# Altium footprint library 8-Crystals.PcbLib: 104 footprints (part 5 of 7)
Each footprint in its own frame and in the unit in brackets; x right, y up, seen from the top. Pads: shape width x height; smd on the part's side, far side on the other; paste and mask are expansions set on the pad; w line width, h text height; cw(c..) or ccw(c..) is an arc to the next point about the centre after c.
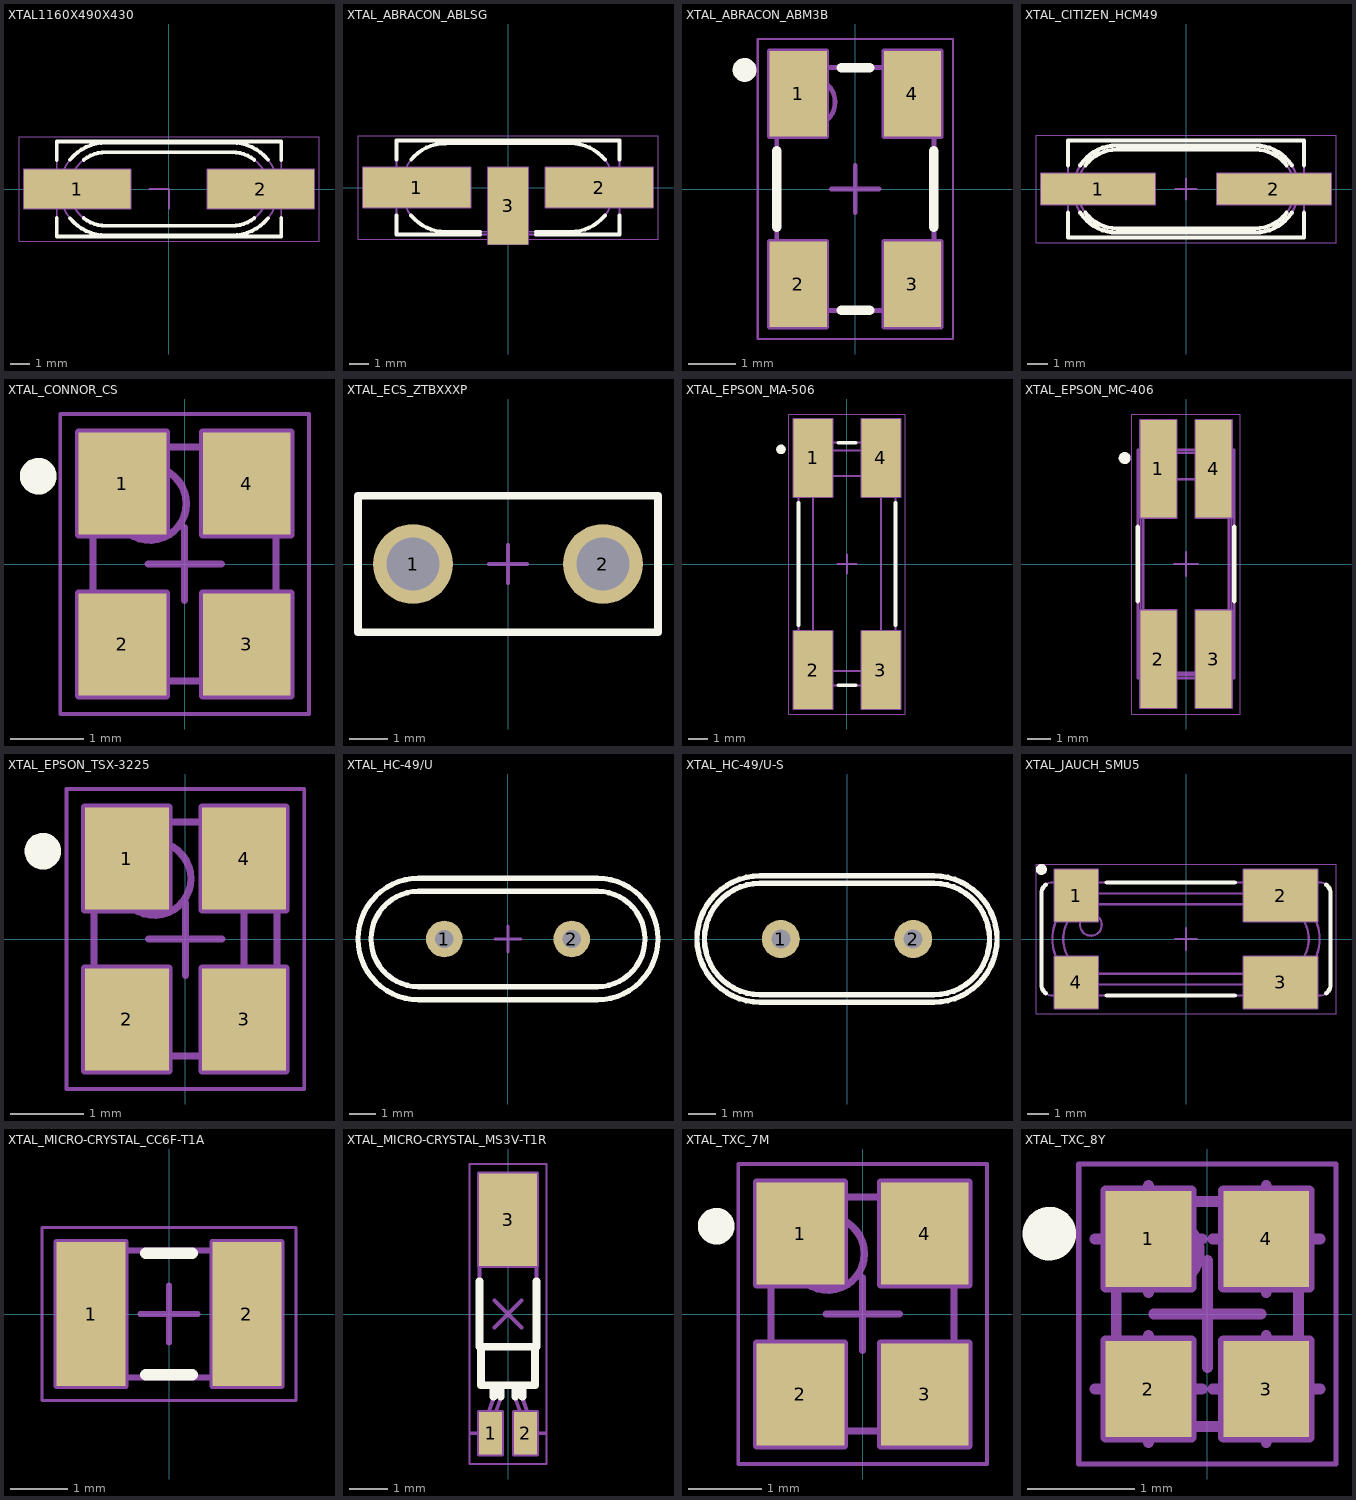
[diagram p4: the footprints below, top view; thin cyan lines are the x and y axes]

## XTAL1160X490X430 [mm] "HC49/4H SMX Case, SMD Cristal, Body 11.6x4.9mm"
height 4.3
pads (2):
  rect 5.5x2 smd: 1(-4.75,0) 2(4.75,0)
Top Overlay:
  lines w0.2: -5.8,-1.5 -5.8,-2.45 5.8,-2.45 5.8,-1.5 ; -5.8,1.5 -5.8,2.45 5.8,2.45 5.8,1.5 ; -5.114,-1.512 ccw(c-3.25,0) -3.25,-2.4 3.25,-2.4 ccw(c3.25,0) 5.114,-1.512 ; -5.114,1.512 cw(c-3.25,0) -3.25,2.4 3.25,2.4 cw(c3.25,0) 5.114,1.512 ; -4.406,-1.508 ccw(c-3.25,0) -3.25,-1.9 3.25,-1.9 ccw(c3.25,0) 4.406,-1.508 ; -4.406,1.508 cw(c-3.25,0) -3.25,1.9 ; -3.211,1.9 3.25,1.9 cw(c3.25,0) 4.406,1.508
Mechanical 8:
  lines w0.1: -5.75,0 -4.75,0 -4.75,-1 ; -1,0 0,0 0,-1 ; 3.75,0 4.75,0 4.75,-1 ; -7.5,-1 -2,-1 -2,1 -7.5,1 -7.5,-1 ; 2,-1 2,1 7.5,1 7.5,-1 2,-1
Mechanical 14:
  lines w0.1: -5.8,-0.3 -6.7,-0.3 -6.7,0.3 -5.8,0.3 ; -5.15,0 ccw(c-3.25,0) -3.25,-1.9 ; 5.15,0 cw(c3.25,0) 3.25,-1.9 ; 5.8,-0.3 6.7,-0.3 6.7,0.3 5.8,0.3 ; -3.25,-1.9 cw(c-3.25,0) -3.25,1.9 3.25,1.9 cw(c3.25,0) 3.25,-1.9 ; -3.25,-1.9 3.25,-1.9 ; -5.8,-2.45 5.8,-2.45 5.8,2.45 -5.8,2.45 -5.8,-2.45 ; -3.25,-2.4 cw(c-3.25,0) -3.25,2.4 3.25,2.4 cw(c3.25,0) 3.25,-2.4 -3.25,-2.4
Mechanical 15:
  lines w0.05: -7.75,-2.7 7.75,-2.7 7.75,2.7 -7.75,2.7 -7.75,-2.7
3D body "p550-200.stp": height 0.02, standoff 0, extent 2,-1 7.5,1
3D body "p550-200.stp": height 0.02, standoff 0, extent -7.5,-1 -2,1
3D body "XTAL_1160X490X430.stp": height 4.3, standoff 0, extent -7.15,-2.45 7.15,2.45

## XTAL_ABRACON_ABLSG [mm] "HC/49US (AT49) SMD Cristal, Body 11.4x4.7mm, ABLSG Serie"
height 4.3
pads (3):
  rect 5.6x2.1 smd: 1(-4.75,0) 2(4.75,0)
  rect 2.1x4 smd: 3(0,-0.95)
Top Overlay:
  lines w0.2: -5.8,-1.45 -5.8,-2.45 -1.45,-2.45 ; -5.8,1.45 -5.8,2.45 5.8,2.45 5.8,1.45 ; -5.036,-1.45 ccw(c-3.25,0) -3.25,-2.3 -1.45,-2.3 ; -5.035,1.45 cw(c-3.25,0) -3.25,2.299 ; -3.25,2.3 3.25,2.3 cw(c3.25,0) 5.035,1.45 ; 1.45,-2.45 5.8,-2.45 5.8,-1.45 ; 1.45,-2.3 3.25,-2.3 ccw(c3.25,0) 5.035,-1.45
Mechanical 8:
  lines w0.1: -5.75,0 -4.75,0 ; -5.25,0 -4.75,0 ; -4.75,-1 -4.75,0 ; -4.75,-0.5 -4.75,0 ; -4.75,0.5 -4.75,0 ; -4.75,1 -4.75,0 ; -4.25,0 -4.75,0 ; -3.75,0 -4.75,0 ; -1,-0.95 0,-0.95 ; -1,0 0,0 ; 0,-1.95 0,-0.95 ; 0,1 0,0 ; 1,-0.95 0,-0.95 ; 1,0 0,0 ; 3.75,0 4.75,0 ; 4.25,0 4.75,0 ; 4.75,-1 4.75,0 ; 4.75,-0.5 4.75,0 ; 4.75,0.5 4.75,0 ; 4.75,1 4.75,0 ; 5.25,0 4.75,0 ; 5.75,0 4.75,0 ; -7.55,-1.05 -1.95,-1.05 -1.95,1.05 -7.55,1.05 -7.55,-1.05 ; -1.05,-2.95 1.05,-2.95 1.05,1.05 -1.05,1.05 -1.05,-2.95 ; 1.95,-1.05 7.55,-1.05 7.55,1.05 1.95,1.05 1.95,-1.05
Mechanical 14:
  lines w0.1: -5.8,-0.3 -6.6,-0.3 -6.6,0.3 -5.8,0.3 ; -3.25,2.299 ccw(c-3.25,0) -3.25,-2.3 3.25,-2.3 ccw(c3.25,0) 3.25,2.3 -3.25,2.3 ; -0.3,-2.45 -0.3,-2.9 0.3,-2.9 0.3,-2.45 ; 5.8,-0.3 6.6,-0.3 6.6,0.3 5.8,0.3 ; -5.8,-2.45 5.8,-2.45 5.8,2.45 -5.8,2.45 -5.8,-2.45
Mechanical 15:
  lines w0.05: -7.8,-2.7 -7.8,2.7 7.8,2.7 7.8,-2.7 -7.8,-2.7
3D body "p400-210.stp": height 0.02, standoff 0, extent -1.05,-3.016 1.05,0.984
3D body "p550-200.stp": height 0.02, standoff 0, extent 2,-1 7.5,1
3D body "p550-200.stp": height 0.02, standoff 0, extent -7.5,-1 -2,1
3D body "XTAL_ABRACON_ABLSG.stp": height 4.2, standoff 0, extent -6.6,-2.9 6.6,2.45

## XTAL_ABRACON_ABM3B [mm] "ABM3B Serie, SMD Cristal, Body 5.x3.2mm"
height 1.1
pads (4):
  rect 1.2x1.8 smd: 1(-1.2,2) 2(-1.2,-2) 3(1.2,-2) 4(1.2,2)
Top Overlay:
  circle w0.25: c-2.325,2.5 r0.125
  lines w0.2: -1.65,-0.8 -1.65,0.8 ; -0.3,-2.55 0.3,-2.55 ; -0.3,2.55 0.3,2.55 ; 1.65,-0.8 1.65,0.8
Mechanical 8:
  lines w0.1: -1.7,-2 -1.2,-2 ; -1.7,2 -1.2,2 ; -1.2,-2.5 -1.2,-2 ; -1.2,-1.5 -1.2,-2 ; -1.2,1.5 -1.2,2 ; -1.2,2.5 -1.2,2 ; -0.7,-2 -1.2,-2 ; -0.7,2 -1.2,2 ; -0.5,0 0,0 ; 0,-0.5 0,0 ; 0,0.5 0,0 ; 0.5,0 0,0 ; 0.7,-2 1.2,-2 ; 0.7,2 1.2,2 ; 1.2,-2.5 1.2,-2 ; 1.2,-1.5 1.2,-2 ; 1.2,1.5 1.2,2 ; 1.2,2.5 1.2,2 ; 1.7,-2 1.2,-2 ; 1.7,2 1.2,2 ; -1.8,-2.9 -0.6,-2.9 -0.6,-1.1 -1.8,-1.1 -1.8,-2.9 ; -1.8,1.1 -0.6,1.1 -0.6,2.9 -1.8,2.9 -1.8,1.1 ; 0.6,-2.9 0.6,-1.1 1.8,-1.1 1.8,-2.9 0.6,-2.9 ; 0.6,1.1 1.8,1.1 1.8,2.9 0.6,2.9 0.6,1.1
Mechanical 14:
  circle w0.1: c-0.925,1.825 r0.5
  lines w0.1: -1.65,2.25 -1.65,-2.25 -1.35,-2.55 1.35,-2.55 1.65,-2.25 1.65,2.25 1.35,2.55 -1.35,2.55 ; -1.65,2.25 -1.35,2.55 ; -1.65,2.25 -1.35,2.55
Mechanical 15:
  lines w0.05: -2.05,-3.15 2.05,-3.15 2.05,3.15 -2.05,3.15 -2.05,-3.15
3D body "XTAL_ABRACON_ABM3B.stp": height 1.1, standoff 0, extent -1.65,-2.55 1.65,2.55
3D body "p180-127.stp": height 0.02, standoff 0, extent -1.835,-2.9 -0.565,-1.1
3D body "p180-127.stp": height 0.02, standoff 0, extent 0.565,-2.9 1.835,-1.1
3D body "p180-127.stp": height 0.02, standoff 0, extent 0.565,1.1 1.835,2.9
3D body "p180-127.stp": height 0.02, standoff 0, extent -1.835,1.1 -0.565,2.9

## XTAL_CITIZEN_HCM49 [mm] "CITIZEN HCM49 Case, SMD Cristal, Body 11.4 x 4.7mm"
height 4.3
pads (2):
  rect 5.5x1.5 smd: 1(-4.25,0) 2(4.25,0)
Top Overlay:
  lines w0.2: -5.7,-1.15 -5.7,-2.35 5.7,-2.35 5.7,-1.15 ; -5.7,1.15 -5.7,2.35 5.7,2.35 5.7,1.15 ; -5.108,-1.15 ccw(c-3.345,0) -3.345,-2.105 3.345,-2.105 ccw(c3.345,0) 5.108,-1.15 ; -5.108,1.15 cw(c-3.345,0) -3.345,2.105 3.345,2.105 cw(c3.345,0) 5.108,1.15 ; -4.864,-1.15 ccw(c-3.345,0) -3.345,-1.905 3.345,-1.905 ccw(c3.345,0) 4.864,-1.15 ; -4.864,1.15 cw(c-3.345,0) -3.345,1.905 3.345,1.905 cw(c3.345,0) 4.864,1.15
Mechanical 8:
  lines w0.1: -4.75,0 -4.25,0 ; -4.25,-0.5 -4.25,0 ; -4.25,0.5 -4.25,0 ; -3.75,0 -4.25,0 ; -0.5,0 0,0 ; 0,-0.5 0,0 ; 0,0.5 0,0 ; 0.5,0 0,0 ; 3.75,0 4.25,0 ; 4.25,-0.5 4.25,0 ; 4.25,0.5 4.25,0 ; 4.75,0 4.25,0 ; -7,-0.75 -7,0.75 -1.5,0.75 -1.5,-0.75 -7,-0.75 ; 1.5,-0.75 1.5,0.75 7,0.75 7,-0.75 1.5,-0.75
Mechanical 14:
  lines w0.1: -5.7,-2.35 -5.7,2.35 5.7,2.35 5.7,-2.35 -5.7,-2.35 ; -3.345,-2.105 cw(c-3.345,0) -3.345,2.105 3.345,2.105 cw(c3.345,0) 3.345,-2.105 -3.345,-2.105 ; -3.345,-1.905 cw(c-3.345,0) -3.345,1.905 3.345,1.905 cw(c3.345,0) 3.345,-1.905 -3.345,-1.905
Mechanical 15:
  lines w0.05: -7.25,-2.6 7.25,-2.6 7.25,2.6 -7.25,2.6 -7.25,-2.6
3D body "XTAL_CITIZEN_HCM49.stp": height 4.3, standoff 0, extent -6.002,-2.35 6.002,2.35
3D body "p550-150.stp": height 0.02, standoff 0, extent -7,-0.75 -1.5,0.75
3D body "p550-150.stp": height 0.02, standoff 0, extent 1.5,-0.75 7,0.75

## XTAL_CONNOR_CS [mm] "4 Pins, 2.5x3.2mm, SMD Sealing Crystal, CS Serie"
height 0.8
pads (4):
  rect 1.2x1.4 smd: 1(-0.85,1.1) 2(-0.85,-1.1) 3(0.85,-1.1) 4(0.85,1.1)
Top Overlay:
  circle w0.25: c-2,1.2 r0.125
Mechanical 8:
  lines w0.1: -1.35,-1.1 -0.85,-1.1 ; -1.35,1.1 -0.85,1.1 ; -0.85,-1.6 -0.85,-1.1 ; -0.85,-0.6 -0.85,-1.1 ; -0.85,0.6 -0.85,1.1 ; -0.85,1.6 -0.85,1.1 ; -0.5,0 0,0 ; -0.35,-1.1 -0.85,-1.1 ; -0.35,1.1 -0.85,1.1 ; 0,-0.5 0,0 ; 0,0.5 0,0 ; 0.35,-1.1 0.85,-1.1 ; 0.35,1.1 0.85,1.1 ; 0.5,0 0,0 ; 0.85,-1.6 0.85,-1.1 ; 0.85,-0.6 0.85,-1.1 ; 0.85,0.6 0.85,1.1 ; 0.85,1.6 0.85,1.1 ; 1.35,-1.1 0.85,-1.1 ; 1.35,1.1 0.85,1.1 ; -1.45,-1.8 -1.45,-0.4 -0.25,-0.4 -0.25,-1.8 -1.45,-1.8 ; -1.45,0.4 -1.45,1.8 -0.25,1.8 -0.25,0.4 -1.45,0.4 ; 0.25,-1.8 0.25,-0.4 1.45,-0.4 1.45,-1.8 0.25,-1.8 ; 0.25,0.4 0.25,1.8 1.45,1.8 1.45,0.4 0.25,0.4
Mechanical 14:
  circle w0.1: c-0.475,0.825 r0.5
  lines w0.1: -1.25,-1.5 cw(c-1.25,-1.6) -1.15,-1.6 1.15,-1.6 cw(c1.25,-1.6) 1.25,-1.5 1.25,1.5 cw(c1.25,1.6) 1.15,1.6 -1.15,1.6 cw(c-1.25,1.6) -1.25,1.5 -1.25,-1.5
Mechanical 15:
  lines w0.05: -1.7,-2.05 -1.7,2.05 1.7,2.05 1.7,-2.05 -1.7,-2.05
3D body "XTAL_CONNOR_CS.stp": height 0.8, standoff 0, extent -1.25,-1.6 1.25,1.6
3D body "p140-120.stp": height 0.02, standoff 0, extent -1.45,-1.8 -0.25,-0.4
3D body "p140-120.stp": height 0.02, standoff 0, extent 0.25,-1.8 1.45,-0.4
3D body "p140-120.stp": height 0.02, standoff 0, extent 0.25,0.4 1.45,1.8
3D body "p140-120.stp": height 0.02, standoff 0, extent -1.45,0.4 -0.25,1.8

## XTAL_ECS_ZTBXXXP [mm] "ZTB Serie Leaded Ceramic Resonator, Body L 7.9 x W 3.6mm H 9.3, Pitch 5mm"
height 9.3
pads (2):
  round 2.1 hole 1.4: 1(-2.5,0) 2(2.5,0)
Top Overlay:
  lines w0.2: -3.95,-1.8 -3.95,1.8 3.95,1.8 3.95,-1.8 -3.95,-1.8
Mechanical 8:
  lines w0.1: -3,0 -2.5,0 ; -2.5,-0.5 -2.5,0 ; -2.5,0.5 -2.5,0 ; -2,0 -2.5,0 ; -0.5,0 0,0 ; 0,-0.5 0,0 ; 0,0.5 0,0 ; 0.5,0 0,0 ; 2,0 2.5,0 ; 2.5,-0.5 2.5,0 ; 2.5,0.5 2.5,0 ; 3,0 2.5,0
Mechanical 14:
  lines w0.1: -3.95,-1.8 3.95,-1.8 3.95,1.8 -3.95,1.8 -3.95,-1.8
3D body "XTAL_ECS_ZTBxxxP.stp": height 9.3, standoff -3.6, extent -3.95,-1.8 3.95,1.8

## XTAL_EPSON_MA-506 [mm] "EPSON Crystal; 12.7mm L X 5.08mm W X 4.6mm H"
height 4.6
pads (4):
  rect 2.05x4.1 smd: 1(-1.775,5.55) 2(-1.775,-5.55) 3(1.775,-5.55) 4(1.775,5.55)
Top Overlay:
  circle w0.25: c-3.455,6 r0.125
  lines w0.2: -2.54,-3.2 -2.54,3.2 ; -0.45,-6.35 0.45,-6.35 ; -0.45,6.35 0.45,6.35 ; 2.54,-3.2 2.54,3.2
Mechanical 8:
  lines w0.1: -2.275,-5.55 -1.775,-5.55 ; -2.275,5.55 -1.775,5.55 ; -1.775,-6.05 -1.775,-5.55 ; -1.775,-5.05 -1.775,-5.55 ; -1.775,5.05 -1.775,5.55 ; -1.775,6.05 -1.775,5.55 ; -1.275,-5.55 -1.775,-5.55 ; -1.275,5.55 -1.775,5.55 ; -0.5,0 0,0 ; 0,-0.5 0,0 ; 0,0.5 0,0 ; 0.5,0 0,0 ; 1.275,-5.55 1.775,-5.55 ; 1.275,5.55 1.775,5.55 ; 1.775,-6.05 1.775,-5.55 ; 1.775,-5.05 1.775,-5.55 ; 1.775,5.05 1.775,5.55 ; 1.775,6.05 1.775,5.55 ; 2.275,-5.55 1.775,-5.55 ; 2.275,5.55 1.775,5.55 ; -2.8,-7.6 -2.8,-3.5 -0.75,-3.5 -0.75,-7.6 -2.8,-7.6 ; -2.8,3.5 -2.8,7.6 -0.75,7.6 -0.75,3.5 -2.8,3.5 ; 0.75,-7.6 0.75,-3.5 2.8,-3.5 2.8,-7.6 0.75,-7.6 ; 0.75,3.5 0.75,7.6 2.8,7.6 2.8,3.5 0.75,3.5
Mechanical 14:
  lines w0.1: -2.54,-6.35 -1.79,-5.6 ; -2.54,-6.35 -2.54,6.35 ; -2.54,-6.35 2.54,-6.35 ; -2.54,6.35 -2.14,5.95 ; -2.54,6.35 2.54,6.35 ; -2.14,5.95 2.14,5.95 ; -2.14,5.95 -1.79,4.6 ; -1.79,-5.6 1.79,-5.6 ; -1.79,-5.6 -1.79,4.6 ; -1.79,4.6 1.79,4.6 ; 1.79,-5.6 2.54,-6.35 ; 1.79,-5.6 1.79,4.6 ; 1.79,4.6 2.14,5.95 ; 2.14,5.95 2.54,6.35 ; 2.54,-6.35 2.54,6.35
Mechanical 15:
  lines w0.05: -3.05,-7.85 -3.05,7.85 3.05,7.85 3.05,-7.85 -3.05,-7.85
3D body "p410-205.stp": height 0.02, standoff 0, extent 0.75,-7.6 2.8,-3.5
3D body "p410-205.stp": height 0.02, standoff 0, extent -2.8,-7.6 -0.75,-3.5
3D body "p410-205.stp": height 0.02, standoff 0, extent 0.75,3.5 2.8,7.6
3D body "p410-205.stp": height 0.02, standoff 0, extent -2.8,3.5 -0.75,7.6
3D body "XTAL_EPSON_MA-506.stp": height 4.6, standoff 0, extent -2.54,-6.73 2.54,6.73

## XTAL_EPSON_MC-406 [mm] "EPSON Crystal; 10.41mm L X 4.06mm W X 3.6mm H"
height 3.6
pads (4):
  rect 1.52x4.1 smd: 1(-1.16,4) 2(-1.16,-4) 3(1.16,-4) 4(1.16,4)
Top Overlay:
  circle w0.25: c-2.575,4.45 r0.125
  lines w0.2: -2.03,-1.55 -2.03,1.55 ; 2.03,-1.55 2.03,1.55
Mechanical 8:
  lines w0.1: -1.66,-4 -1.16,-4 ; -1.66,4 -1.16,4 ; -1.16,-4.5 -1.16,-4 ; -1.16,-3.5 -1.16,-4 ; -1.16,3.5 -1.16,4 ; -1.16,4.5 -1.16,4 ; -0.66,-4 -1.16,-4 ; -0.66,4 -1.16,4 ; -0.5,0 0,0 ; 0,-0.5 0,0 ; 0,0.5 0,0 ; 0.5,0 0,0 ; 0.66,-4 1.16,-4 ; 0.66,4 1.16,4 ; 1.16,-4.5 1.16,-4 ; 1.16,-3.5 1.16,-4 ; 1.16,3.5 1.16,4 ; 1.16,4.5 1.16,4 ; 1.66,-4 1.16,-4 ; 1.66,4 1.16,4 ; -1.92,-6.05 -1.92,-1.95 -0.4,-1.95 -0.4,-6.05 -1.92,-6.05 ; -1.92,1.95 -1.92,6.05 -0.4,6.05 -0.4,1.95 -1.92,1.95 ; 0.4,-6.05 0.4,-1.95 1.92,-1.95 1.92,-6.05 0.4,-6.05 ; 0.4,1.95 0.4,6.05 1.92,6.05 1.92,1.95 0.4,1.95
Mechanical 14:
  circle w0.1: c-1.025,2.575 r0.5
  lines w0.1: -1.4,-4.8 -1.4,-5.405 -0.89,-5.405 -0.89,-4.8 ; -0.89,4.8 -0.89,5.39 -1.4,5.39 -1.4,4.8 ; 0.89,-4.8 0.89,-5.405 1.4,-5.405 1.4,-4.8 ; 0.89,4.8 0.89,5.405 1.4,5.405 1.4,4.8 ; -2.03,-4.8 -1.79,-4.56 ; -2.03,-4.8 -2.03,4.8 ; -2.03,-4.8 2.03,-4.8 ; -2.03,4.8 -1.91,4.68 ; -2.03,4.8 2.03,4.8 2.03,-4.8 ; -2.03,4.8 -1.4,4.8 ; -2.03,4.8 -1.4,4.8 ; -1.91,4.68 1.91,4.68 ; -1.91,4.68 -1.91,-4.68 1.91,-4.68 1.91,4.68 ; -1.91,4.68 -1.79,3.56 ; -1.79,-4.56 -1.79,3.56 ; -1.79,-4.56 1.79,-4.56 ; -1.79,3.56 1.79,3.56 ; 1.79,-4.56 2.03,-4.8 ; 1.79,-4.56 1.79,3.56 ; 1.79,3.56 1.91,4.68
Mechanical 15:
  lines w0.05: -2.28,-6.3 2.28,-6.3 2.28,6.3 -2.28,6.3 -2.28,-6.3
3D body "XTAL_EPSON_MC-406.stp": height 3.6, standoff 0, extent -2.03,-5.405 2.03,5.405
3D body "p410-152.stp": height 0.02, standoff 0, extent -1.92,1.95 -0.4,6.05
3D body "p410-152.stp": height 0.02, standoff 0, extent 0.4,1.95 1.92,6.05
3D body "p410-152.stp": height 0.02, standoff 0, extent -1.92,-6.05 -0.4,-1.95
3D body "p410-152.stp": height 0.02, standoff 0, extent 0.4,-6.05 1.92,-1.95

## XTAL_EPSON_TSX-3225 [mm] "Oscillator TSX-3225 Serie, Corner Concave; 4 pin, 2.50mm L X 3.2mm W X 0.6mm H"
height 0.6
pads (4):
  rect 1.15x1.4 smd: 1(-0.8,1.1) 2(-0.8,-1.1) 3(0.8,-1.1) 4(0.8,1.1)
Top Overlay:
  circle w0.25: c-1.95,1.2 r0.125
Mechanical 8:
  lines w0.1: -1.3,-1.1 -0.8,-1.1 ; -1.3,1.1 -0.8,1.1 ; -0.8,-1.6 -0.8,-1.1 ; -0.8,-0.6 -0.8,-1.1 ; -0.8,0.6 -0.8,1.1 ; -0.8,1.6 -0.8,1.1 ; -0.75,0.93 -0.75,1.43 ; -0.5,0 0,0 ; -0.3,-1.1 -0.8,-1.1 ; -0.3,1.1 -0.8,1.1 ; 0,-0.5 0,0 ; 0,0.5 0,0 ; 0.3,-1.1 0.8,-1.1 ; 0.3,1.1 0.8,1.1 ; 0.5,0 0,0 ; 0.8,-1.6 0.8,-1.1 ; 0.8,-0.6 0.8,-1.1 ; 0.8,0.6 0.8,1.1 ; 0.8,1.6 0.8,1.1 ; 1.3,-1.1 0.8,-1.1 ; 1.3,1.1 0.8,1.1 ; 0.8,-1.1 0.8,1.1 ; -1.375,-1.8 -1.375,-0.4 -0.225,-0.4 -0.225,-1.8 -1.375,-1.8 ; -1.375,0.4 -1.375,1.8 -0.225,1.8 -0.225,0.4 -1.375,0.4 ; 0.225,-1.8 0.225,-0.4 1.375,-0.4 1.375,-1.8 0.225,-1.8 ; 0.225,0.4 0.225,1.8 1.375,1.8 1.375,0.4 0.225,0.4
Mechanical 14:
  circle w0.1: c-0.425,0.825 r0.5
  lines w0.1: -1.25,-1.5 cw(c-1.25,-1.6) -1.15,-1.6 1.15,-1.6 cw(c1.25,-1.6) 1.25,-1.5 1.25,1.5 cw(c1.25,1.6) 1.15,1.6 -1.15,1.6 cw(c-1.25,1.6) -1.25,1.5 -1.25,-1.5
Mechanical 15:
  lines w0.05: -1.625,-2.05 -1.625,2.05 1.625,2.05 1.625,-2.05 -1.625,-2.05
3D body "p140-115.stp": height 0.02, standoff 0, extent 0.225,-1.8 1.375,-0.4
3D body "p140-115.stp": height 0.02, standoff 0, extent -1.375,-1.8 -0.225,-0.4
3D body "p140-115.stp": height 0.02, standoff 0, extent 0.225,0.4 1.375,1.8
3D body "p140-115.stp": height 0.02, standoff 0, extent -1.375,0.4 -0.225,1.8
3D body "XTAL_EPSON_TSX-3225.stp": height 0.6, standoff 0, extent -1.25,-1.6 1.25,1.6

## XTAL_HC-49/U [mm] "HC-49/U Leaded Cristal, Body 11.05x4.8mm; Pitch 4.88mm"
height 13.6
pads (2):
  round 1.4 hole 0.7: 1(-2.44,0) 2(2.44,0)
Top Overlay:
  lines w0.2: -5.75,0 ccw(c-3.42,0) -3.42,-2.33 3.42,-2.33 ccw(c3.42,0) 5.75,0 ccw(c3.42,0) 3.42,2.33 -3.42,2.33 ccw(c-3.42,0) -5.75,0 ; -5.25,0 ccw(c-3.42,0) -3.42,-1.83 3.42,-1.83 ccw(c3.42,0) 5.25,0 ccw(c3.42,0) 3.42,1.83 -3.42,1.83 ccw(c-3.42,0) -5.25,0
Mechanical 8:
  lines w0.1: -2.94,0 -2.44,0 ; -2.44,-0.5 -2.44,0 ; -2.44,0.5 -2.44,0 ; -1.94,0 -2.44,0 ; -0.5,0 0,0 ; 0,-0.5 0,0 ; 0,0.5 0,0 ; 0.5,0 0,0 ; 1.94,0 2.44,0 ; 2.44,-0.5 2.44,0 ; 2.44,0.5 2.44,0 ; 2.94,0 2.44,0
Mechanical 14:
  lines w0.1: -5.75,0 ccw(c-3.42,0) -3.42,-2.33 3.42,-2.33 ccw(c3.42,0) 5.75,0 ccw(c3.42,0) 3.42,2.33 -3.42,2.33 ccw(c-3.42,0) -5.75,0 ; -5.25,0 ccw(c-3.42,0) -3.42,-1.83 3.42,-1.83 ccw(c3.42,0) 5.25,0 ccw(c3.42,0) 3.42,1.83 -3.42,1.83 ccw(c-3.42,0) -5.25,0
3D body "XTAL_CITIZEN_HC-49-U-S.stp": height 3.5, standoff -3.6, extent -5.75,-2.33 5.75,2.33

## XTAL_HC-49/U-S [mm] "HC-49/U-S Leaded Cristal, Body 11.5x4.66mm; Pitch 4.88mm"
height 3.5
pads (2):
  round 1.4 hole 0.7: 1(-2.44,0) 2(2.44,0)
Top Overlay:
  lines w0.2: -3.2,-2.325 cw(c-3.2,0) -3.2,2.325 3.2,2.325 cw(c3.2,0) 3.2,-2.325 -3.2,-2.325 ; -3.2,-2.05 cw(c-3.2,0) -3.2,2.05 3.2,2.05 cw(c3.2,0) 3.2,-2.05 -3.2,-2.05
Mechanical 14:
  lines w0.1: -3.2,-2.325 cw(c-3.2,0) -3.2,2.325 3.2,2.325 cw(c3.2,0) 3.2,-2.325 -3.2,-2.325 ; -3.2,-2.05 cw(c-3.2,0) -3.2,2.05 3.2,2.05 cw(c3.2,0) 3.2,-2.05 -3.2,-2.05
3D body "XTAL_HC-49-U.stp": height 13.6, standoff -3.6, extent -5.525,-2.4 5.525,2.4

## XTAL_JAUCH_SMU5 [mm] "JAUCH SMU5 Crystal; 13.1mm L X 5mm W X 5.1mm H"
height 5.1
pads (4):
  rect 2x2.4 smd: 1(-5.05,2) 4(-5.05,-2)
  rect 3.4x2.4 smd: 2(4.35,2) 3(4.35,-2)
Top Overlay:
  circle w0.25: c-6.65,3.2 r0.125
  lines w0.2: -6.45,-2.5 cw(c-6.15,-2.1) -6.65,-2.1 -6.65,2.1 cw(c-6.15,2.1) -6.45,2.5 ; -3.65,-2.6 2.25,-2.6 ; -3.65,2.6 2.25,2.6 ; 6.45,-2.5 ccw(c6.15,-2.1) 6.65,-2.1 6.65,2.1 ccw(c6.15,2.1) 6.45,2.5
Mechanical 8:
  lines w0.1: -5.55,-2 -5.05,-2 ; -5.55,2 -5.05,2 ; -5.05,-2.5 -5.05,-2 ; -5.05,-1.5 -5.05,-2 ; -5.05,1.5 -5.05,2 ; -5.05,2.5 -5.05,2 ; -4.55,-2 -5.05,-2 ; -4.55,2 -5.05,2 ; -0.5,0 0,0 ; 0,-0.5 0,0 ; 0,0.5 0,0 ; 0.5,0 0,0 ; 3.85,-2 4.35,-2 ; 3.85,2 4.35,2 ; 4.35,-2.5 4.35,-2 ; 4.35,-1.5 4.35,-2 ; 4.35,1.5 4.35,2 ; 4.35,2.5 4.35,2 ; 4.85,-2 4.35,-2 ; 4.85,2 4.35,2 ; -6.05,-3.2 -4.05,-3.2 -4.05,-0.8 -6.05,-0.8 -6.05,-3.2 ; -6.05,0.8 -4.05,0.8 -4.05,3.2 -6.05,3.2 -6.05,0.8 ; 2.65,-3.2 2.65,-0.8 6.05,-0.8 6.05,-3.2 2.65,-3.2 ; 2.65,0.8 2.65,3.2 6.05,3.2 6.05,0.8 2.65,0.8
Mechanical 14:
  circle w0.1: c-4.375,0.65 r0.5
  lines w0.1: -6.65,-2.1 ccw(c-6.15,-2.1) -6.15,-2.6 6.15,-2.6 ccw(c6.15,-2.1) 6.65,-2.1 6.65,2.1 ccw(c6.15,2.1) 6.15,2.6 -6.15,2.6 ccw(c-6.15,2.1) -6.65,2.1 -6.65,-2.1 ; -4.05,-2.1 cw(c-4.05,0) -4.05,2.1 4.05,2.1 cw(c4.05,0) 4.05,-2.1 -4.05,-2.1 ; -4.05,-1.6 cw(c-4.05,0) -4.05,1.6 4.05,1.6 cw(c4.05,0) 4.05,-1.6 -4.05,-1.6
Mechanical 15:
  lines w0.05: -6.9,-3.45 -6.9,3.45 6.9,3.45 6.9,-3.45 -6.9,-3.45
3D body "p340-240.stp": height 0.02, standoff 0, extent 2.65,0.8 6.05,3.2
3D body "p340-240.stp": height 0.02, standoff 0, extent 2.65,-3.2 6.05,-0.8
3D body "p240-200.stp": height 0.02, standoff 0, extent -6.05,0.8 -4.05,3.2
3D body "p240-200.stp": height 0.02, standoff 0, extent -6.05,-3.2 -4.05,-0.8
3D body "XTAL_JAUCH_SMU5.stp": height 5.1, standoff 0, extent -6.65,-2.6 6.65,2.6

## XTAL_MICRO-CRYSTAL_CC6F-T1A [mm] "DFN Case Style, Cristal, Body 3.5x2.5mm, CC6F-T1A Serie"
height 0.8
pads (2):
  rect 1.2x2.5 smd: 1(-1.35,0) 2(1.35,0)
Top Overlay:
  lines w0.2: -0.4,-1.05 0.4,-1.05 ; -0.4,1.05 0.4,1.05
Mechanical 8:
  lines w0.1: -1.85,0 -1.35,0 ; -1.35,-0.5 -1.35,0 ; -1.35,0.5 -1.35,0 ; -0.85,0 -1.35,0 ; -0.5,0 0,0 ; 0,-0.5 0,0 ; 0,0.5 0,0 ; 0.5,0 0,0 ; 0.85,0 1.35,0 ; 1.35,-0.5 1.35,0 ; 1.35,0.5 1.35,0 ; 1.85,0 1.35,0 ; -1.95,-1.25 -1.95,1.25 -0.75,1.25 -0.75,-1.25 -1.95,-1.25 ; 0.75,-1.25 0.75,1.25 1.95,1.25 1.95,-1.25 0.75,-1.25
Mechanical 14:
  lines w0.1: -1.75,-1.05 cw(c-1.75,-1.1) -1.7,-1.1 1.7,-1.1 cw(c1.75,-1.1) 1.75,-1.05 1.75,1.05 cw(c1.75,1.1) 1.7,1.1 -1.7,1.1 cw(c-1.75,1.1) -1.75,1.05 -1.75,-1.05
Mechanical 15:
  lines w0.05: -2.2,-1.5 2.2,-1.5 2.2,1.5 -2.2,1.5 -2.2,-1.5
3D body "XTAL_MICRO-CRYSTAL_CC6F-T1A.stp": height 0.8, standoff 0, extent -1.75,-1.1 1.75,1.1
3D body "p250-120.stp": height 0.02, standoff 0, extent -1.95,-1.25 -0.75,1.25
3D body "p250-120.stp": height 0.02, standoff 0, extent 0.75,-1.25 1.95,1.25

## XTAL_MICRO-CRYSTAL_MS3V-T1R [mm] "2 Pins, 1.4 x 5.2 x 1.4mm , SMD Crystal, MS3V-T1R Serie"
height 1.48
pads (3):
  rect 0.6x1.1 smd: 1(-0.45,-3.1) 2(0.45,-3.1)
  rect 1.5x2.4 smd: 3(0,2.45)
Top Overlay:
  lines w0.2: -0.74,0.85 -0.74,-0.85 0.74,-0.85 0.74,0.85 ; -0.7,-0.85 -0.7,-1.85 0.7,-1.85 0.7,-0.85 ; -0.375,-2.15 -0.375,-1.85 ; -0.187,-2.15 -0.187,-1.85 ; 0.187,-2.15 0.187,-1.85 ; 0.375,-2.15 0.375,-1.85
Mechanical 8:
  lines w0.1: -0.95,-3.1 -0.45,-3.1 ; -0.5,2.45 0,2.45 ; -0.45,-3.6 -0.45,-3.1 ; -0.45,-2.6 -0.45,-3.1 ; -0.354,-0.354 0,0 ; -0.354,0.354 0,0 ; 0,1.95 0,2.45 ; 0,2.95 0,2.45 ; 0.354,-0.354 0,0 ; 0.354,0.354 0,0 ; 0.45,-3.6 0.45,-3.1 ; 0.45,-2.6 0.45,-3.1 ; 0.5,2.45 0,2.45 ; 0.95,-3.1 0.45,-3.1 ; -0.75,-3.65 -0.15,-3.65 -0.15,-2.55 -0.75,-2.55 -0.75,-3.65 ; -0.75,1.25 -0.75,3.65 0.75,3.65 0.75,1.25 -0.75,1.25 ; 0.15,-3.65 0.75,-3.65 0.75,-2.55 0.15,-2.55 0.15,-3.65
Mechanical 14:
  lines w0.1: -0.7,-0.85 -0.7,-1.85 0.7,-1.85 0.7,-0.85 ; -0.375,-1.85 -0.375,-2.194 -0.594,-2.803 -0.594,-3.35 -0.406,-3.35 -0.406,-2.803 -0.187,-2.194 -0.187,-1.85 ; 0.187,-1.85 0.187,-2.194 0.406,-2.803 0.406,-3.35 0.594,-3.35 0.594,-2.803 0.375,-2.194 0.375,-1.85 ; -0.74,-0.85 -0.74,3.35 0.74,3.35 0.74,-0.85 -0.74,-0.85
Mechanical 15:
  lines w0.05: -1,-3.9 -1,3.9 1,3.9 1,-3.9 -1,-3.9
3D body "XTAL_MICRO-CRYSTAL_MS3V-T1R.stp": height 1.48, standoff 0, extent -0.74,-3.35 0.74,3.35
3D body "p240-150.stp": height 0.02, standoff 0, extent -0.75,1.25 0.75,3.65
3D body "p110-060.stp": height 0.02, standoff 0, extent -0.75,-3.65 -0.15,-2.55
3D body "p110-060.stp": height 0.02, standoff 0, extent 0.15,-3.65 0.75,-2.55

## XTAL_TXC_7M [mm] "4 Pins, 2.5x3.2mm, SMD Sealing Crystal, 7M Serie"
height 0.8
pads (4):
  rect 1.2x1.4 smd: 1(-0.85,1.1) 2(-0.85,-1.1) 3(0.85,-1.1) 4(0.85,1.1)
Top Overlay:
  circle w0.25: c-2,1.2 r0.125
Mechanical 8:
  lines w0.1: -1.35,-1.1 -0.85,-1.1 ; -1.35,1.1 -0.85,1.1 ; -0.85,-1.6 -0.85,-1.1 ; -0.85,-0.6 -0.85,-1.1 ; -0.85,0.6 -0.85,1.1 ; -0.85,1.6 -0.85,1.1 ; -0.5,0 0,0 ; -0.35,-1.1 -0.85,-1.1 ; -0.35,1.1 -0.85,1.1 ; 0,-0.5 0,0 ; 0,0.5 0,0 ; 0.35,-1.1 0.85,-1.1 ; 0.35,1.1 0.85,1.1 ; 0.5,0 0,0 ; 0.85,-1.6 0.85,-1.1 ; 0.85,-0.6 0.85,-1.1 ; 0.85,0.6 0.85,1.1 ; 0.85,1.6 0.85,1.1 ; 1.35,-1.1 0.85,-1.1 ; 1.35,1.1 0.85,1.1 ; -1.45,-1.8 -0.25,-1.8 -0.25,-0.4 -1.45,-0.4 -1.45,-1.8 ; -1.45,0.4 -0.25,0.4 -0.25,1.8 -1.45,1.8 -1.45,0.4 ; 0.25,-1.8 1.45,-1.8 1.45,-0.4 0.25,-0.4 0.25,-1.8 ; 0.25,0.4 1.45,0.4 1.45,1.8 0.25,1.8 0.25,0.4
Mechanical 14:
  circle w0.1: c-0.475,0.825 r0.5
  lines w0.1: -1.25,-1.5 cw(c-1.25,-1.6) -1.15,-1.6 1.15,-1.6 cw(c1.25,-1.6) 1.25,-1.5 1.25,1.5 cw(c1.25,1.6) 1.15,1.6 -1.15,1.6 cw(c-1.25,1.6) -1.25,1.5 -1.25,-1.5
Mechanical 15:
  lines w0.05: -1.7,-2.05 1.7,-2.05 1.7,2.05 -1.7,2.05 -1.7,-2.05
3D body "p140-120.stp": height 0.02, standoff 0, extent -1.45,0.4 -0.25,1.8
3D body "p140-120.stp": height 0.02, standoff 0, extent 0.25,0.4 1.45,1.8
3D body "p140-120.stp": height 0.02, standoff 0, extent 0.25,-1.8 1.45,-0.4
3D body "p140-120.stp": height 0.02, standoff 0, extent -1.45,-1.8 -0.25,-0.4
3D body "XTAL_TXC_7M.stp": height 0.8, standoff 0, extent -1.25,-1.6 1.25,1.6

## XTAL_TXC_8Y [mm] "4 Pins, 2x1.6mm, SMD Seam Sealing Crystal, 8Y Serie"
height 0.5
pads (4):
  rect 0.8x0.9 smd: 1(-0.55,0.7) 2(-0.55,-0.7) 3(0.55,-0.7) 4(0.55,0.7)
Top Overlay:
  circle w0.25: c-1.475,0.75 r0.125
Mechanical 8:
  lines w0.1: -1.05,-0.7 -0.55,-0.7 ; -1.05,0.7 -0.55,0.7 ; -0.55,-1.2 -0.55,-0.7 ; -0.55,-0.2 -0.55,-0.7 ; -0.55,0.2 -0.55,0.7 ; -0.55,1.2 -0.55,0.7 ; -0.5,0 0,0 ; -0.05,-0.7 -0.55,-0.7 ; -0.05,0.7 -0.55,0.7 ; 0,-0.5 0,0 ; 0,0.5 0,0 ; 0.05,-0.7 0.55,-0.7 ; 0.05,0.7 0.55,0.7 ; 0.5,0 0,0 ; 0.55,-1.2 0.55,-0.7 ; 0.55,-0.2 0.55,-0.7 ; 0.55,0.2 0.55,0.7 ; 0.55,1.2 0.55,0.7 ; 1.05,-0.7 0.55,-0.7 ; 1.05,0.7 0.55,0.7 ; -0.95,-1.15 -0.95,-0.25 -0.15,-0.25 -0.15,-1.15 -0.95,-1.15 ; -0.95,0.25 -0.95,1.15 -0.15,1.15 -0.15,0.25 -0.95,0.25 ; 0.15,-1.15 0.15,-0.25 0.95,-0.25 0.95,-1.15 0.15,-1.15 ; 0.15,0.25 0.15,1.15 0.95,1.15 0.95,0.25 0.15,0.25
Mechanical 14:
  circle w0.1: c-0.375,0.575 r0.3
  lines w0.1: -0.85,-0.95 cw(c-0.85,-1.05) -0.75,-1.05 0.75,-1.05 cw(c0.85,-1.05) 0.85,-0.95 0.85,0.95 cw(c0.85,1.05) 0.75,1.05 -0.75,1.05 cw(c-0.85,1.05) -0.85,0.95 -0.85,-0.95
Mechanical 15:
  lines w0.05: -1.2,-1.4 -1.2,1.4 1.2,1.4 1.2,-1.4 -1.2,-1.4
3D body "XTAL_TXC_8Y.stp": height 0.5, standoff 0, extent -0.85,-1.05 0.85,1.05
3D body "p090-080.stp": height 0.02, standoff 0, extent -0.95,-1.15 -0.15,-0.25
3D body "p090-080.stp": height 0.02, standoff 0, extent -0.95,0.25 -0.15,1.15
3D body "p090-080.stp": height 0.02, standoff 0, extent 0.15,0.25 0.95,1.15
3D body "p090-080.stp": height 0.02, standoff 0, extent 0.15,-1.15 0.95,-0.25